# Altium footprint library Connectors.PcbLib: 245 footprints (part 15 of 18)
Each footprint in its own frame and in the unit in brackets; x right, y up, seen from the top. Pads: shape width x height; smd on the part's side, far side on the other; paste and mask are expansions set on the pad; w line width, h text height; cw(c..) or ccw(c..) is an arc to the next point about the centre after c.
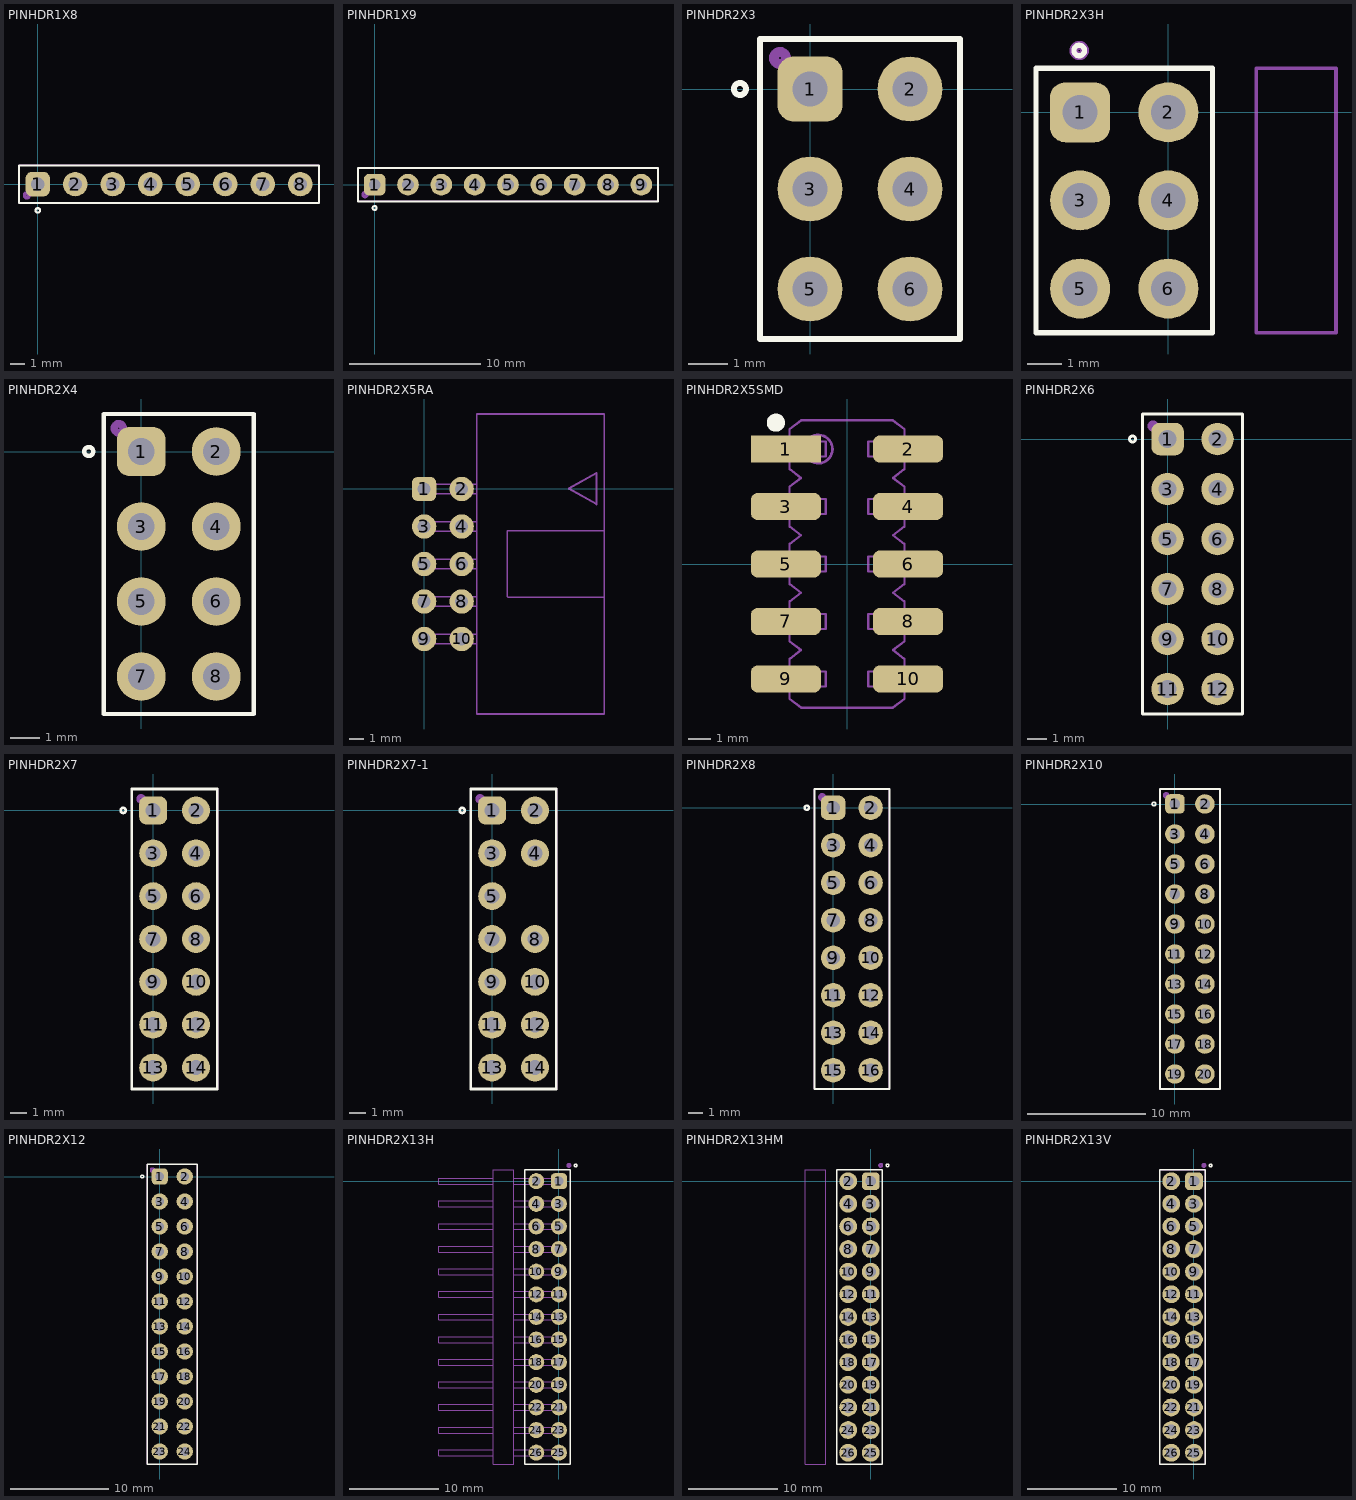
[diagram p14: the footprints below, top view; thin cyan lines are the x and y axes]

## PINHDR1X8 [mil] "Pin header 1x8 pin R2.54mm"
height 433.07
pads (8):
  rrect50% 65x65 hole 35.43 paste-50: 1(0,0)
  round 65 hole 35.43 paste-50: 2(100,0) 3(200,0) 4(300,0) 5(400,0) 6(500,0) 7(600,0) 8(700,0)
Top Overlay:
  circle w5.91: c0,-70 r6
  lines w5.91: -50,-50 750,-50 750,50 -50,50 -50,-50
Mechanical 13:
  circle w10: c-29,-30 r6
  lines w4: -50,-50 750,-50 750,50 -50,50 -50,-50 ; -13,-13 -13,13 13,13 13,-13 -13,-13 ; 87,-13 87,13 113,13 113,-13 87,-13 ; 187,-13 187,13 213,13 213,-13 187,-13 ; 287,-13 287,13 313,13 313,-13 287,-13 ; 387,-13 387,13 413,13 413,-13 387,-13 ; 487,-13 487,13 513,13 513,-13 487,-13 ; 587,-13 587,13 613,13 613,-13 587,-13 ; 687,-13 687,13 713,13 713,-13 687,-13
3D body: height 314.96, standoff -125.98, extent 687,-13 713,13
3D body: height 314.96, standoff -125.98, extent 587,-13 613,13
3D body: height 100, standoff 0, extent -50,-50 750,50
3D body: height 314.96, standoff -125.98, extent 87,-13 113,13
3D body: height 314.96, standoff -125.98, extent -13,-13 13,13
3D body: height 314.96, standoff -125.98, extent 187,-13 213,13
3D body: height 314.96, standoff -125.98, extent 287,-13 313,13
3D body: height 314.96, standoff -125.98, extent 487,-13 513,13
3D body: height 314.96, standoff -125.98, extent 387,-13 413,13

## PINHDR1X9 [mil] "Pin header 1x9 pin R2.54mm"
height 433.07
pads (9):
  rrect50% 65x65 hole 35.43 paste-50: 1(0,0)
  round 65 hole 35.43 paste-50: 2(100,0) 3(200,0) 4(300,0) 5(400,0) 6(500,0) 7(600,0) 8(700,0) 9(800,0)
Top Overlay:
  circle w5.91: c0,-70 r6
  lines w5.91: -50,-50 850,-50 850,50 -50,50 -50,-50
Mechanical 13:
  circle w10: c-29,-30 r6
  lines w4: -50,-50 850,-50 850,50 -50,50 -50,-50 ; -13,-13 13,-13 13,13 -13,13 -13,-13 ; 87,-13 113,-13 113,13 87,13 87,-13 ; 187,-13 213,-13 213,13 187,13 187,-13 ; 287,-13 313,-13 313,13 287,13 287,-13 ; 387,-13 413,-13 413,13 387,13 387,-13 ; 487,-13 513,-13 513,13 487,13 487,-13 ; 587,-13 613,-13 613,13 587,13 587,-13 ; 687,-13 713,-13 713,13 687,13 687,-13 ; 787,-13 813,-13 813,13 787,13 787,-13
3D body: height 366.14, standoff -137.8, extent 687,-13 713,13
3D body: height 366.14, standoff -137.8, extent 787,-13 813,13
3D body: height 366.14, standoff -137.8, extent 587,-13 613,13
3D body: height 100, standoff 0, extent -50,-50 850,50
3D body: height 366.14, standoff -137.8, extent 87,-13 113,13
3D body: height 366.14, standoff -137.8, extent -13,-13 13,13
3D body: height 366.14, standoff -137.8, extent 187,-13 213,13
3D body: height 366.14, standoff -137.8, extent 287,-13 313,13
3D body: height 366.14, standoff -137.8, extent 487,-13 513,13
3D body: height 366.14, standoff -137.8, extent 387,-13 413,13

## PINHDR2X3 [mil] "Pin header 2x3 pin R2.54mm"
height 433.07
pads (6):
  rrect50% 65x65 hole 35.43 paste-50: 1(0,0)
  round 65 hole 35.43 paste-50: 2(100,0) 3(0,-100) 4(100,-100) 5(0,-200) 6(100,-200)
Top Overlay:
  circle w5.91: c-70,0 r6
  lines w5.91: -50,-250 150,-250 150,50 -50,50 -50,-250
Mechanical 13:
  circle w10: c-30,31 r6
  lines w4: -50,-250 -50,50 150,50 150,-250 -50,-250 ; -13,-213 13,-213 13,-187 -13,-187 -13,-213 ; -13,-113 13,-113 13,-87 -13,-87 -13,-113 ; -13,-13 13,-13 13,13 -13,13 -13,-13 ; 87,-213 113,-213 113,-187 87,-187 87,-213 ; 87,-113 113,-113 113,-87 87,-87 87,-113 ; 87,-13 113,-13 113,13 87,13 87,-13
3D body: height 314.96, standoff -125.98, extent -13,-213 13,-187
3D body: height 314.96, standoff -125.98, extent 87,-213 113,-187
3D body: height 314.96, standoff -125.98, extent -13,-113 13,-87
3D body: height 314.96, standoff -125.98, extent 87,-113 113,-87
3D body: height 314.96, standoff -125.98, extent 87,-13 113,13
3D body: height 314.96, standoff -125.98, extent -13,-13 13,13
3D body: height 100, standoff 0, extent -50,-250 150,50

## PINHDR2X3H [mil] "Pin header 2x3 pin R2.54mm Horizontal"
height 321.26
pads (6):
  rrect50% 68x68 hole 39.37 paste-50: 1(-100,0)
  round 68 hole 39.37 paste-50: 2(0,0) 3(-100,-100) 4(0,-100) 5(-100,-200) 6(0,-200)
Top Overlay:
  circle w5.91: c-101,70 r6
  lines w5.91: -150,-250 50,-250 50,50 -150,50 -150,-250
Mechanical 13:
  circle w10: c-101,70 r6
  lines w4: 100,-250 190.16,-250 190.16,50 100,50 100,-250
3D body: height 147.64, standoff 0, extent -113,-13 -87,13
3D body: height 147.64, standoff 0, extent -113,-113 -87,-87
3D body: height 147.64, standoff 0, extent -113,-213 -87,-187
3D body: height 49.21, standoff 0, extent -13,-13 13,13
3D body: height 49.21, standoff 0, extent -13,-113 13,-87
3D body: height 49.21, standoff 0, extent -13,-213 13,-187
3D body: height 196.85, standoff 0, extent 100,-250 190.16,50
3D body: height 74.8, standoff 49.21, extent -13,-213 100,-187
3D body: height 74.8, standoff 49.21, extent -13,-113 100,-87
3D body: height 74.8, standoff 49.21, extent -13,-13 100,13
3D body: height 174.41, standoff 147.64, extent -113,-213 100,-187
3D body: height 174.41, standoff 147.64, extent -113,-113 100,-87
3D body: height 174.41, standoff 147.64, extent -113,-13 100,13
3D body: height 174.41, standoff 147.64, extent 190.16,-213 430,-187
3D body: height 174.41, standoff 147.64, extent 190.16,-113 430,-87
3D body: height 174.41, standoff 147.64, extent 190.16,-13 430,13
3D body: height 74.8, standoff 49.21, extent 190.16,-213 430,-187
3D body: height 74.8, standoff 49.21, extent 190.16,-113 430,-87
3D body: height 74.8, standoff 49.21, extent 190.16,-13 430,13

## PINHDR2X4 [mil] "Pin header 2x4 pin R2.54mm"
height 433.07
pads (8):
  rrect50% 65x65 hole 35.43 paste-50: 1(0,0)
  round 65 hole 35.43 paste-50: 2(100,0) 3(0,-100) 4(100,-100) 5(0,-200) 6(100,-200) 7(0,-300) 8(100,-300)
Top Overlay:
  circle w5.91: c-70,0 r6
  lines w5.91: -50,-350 -50,50 150,50 150,-350 -50,-350
Mechanical 13:
  circle w10: c-30,31 r6
  lines w4: -50,-350 -50,50 150,50 150,-350 -50,-350 ; -13,-313 13,-313 13,-287 -13,-287 -13,-313 ; -13,-213 13,-213 13,-187 -13,-187 -13,-213 ; -13,-113 13,-113 13,-87 -13,-87 -13,-113 ; -13,-13 -13,13 13,13 13,-13 -13,-13 ; 87,-313 113,-313 113,-287 87,-287 87,-313 ; 87,-213 113,-213 113,-187 87,-187 87,-213 ; 87,-113 113,-113 113,-87 87,-87 87,-113 ; 87,-13 87,13 113,13 113,-13 87,-13
3D body: height 314.96, standoff -125.98, extent -13,-313 13,-287
3D body: height 314.96, standoff -125.98, extent 87,-313 113,-287
3D body: height 314.96, standoff -125.98, extent -13,-213 13,-187
3D body: height 314.96, standoff -125.98, extent 87,-213 113,-187
3D body: height 314.96, standoff -125.98, extent -13,-113 13,-87
3D body: height 314.96, standoff -125.98, extent 87,-113 113,-87
3D body: height 100, standoff 0, extent -50,-350 150,50
3D body: height 314.96, standoff -125.98, extent 87,-13 113,13
3D body: height 314.96, standoff -125.98, extent -13,-13 13,13

## PINHDR2X5RA [mil] "Pin header 2x5 pin R2.54mm"
height 433.07
pads (10):
  rrect50% 65x65 hole 35.43 paste-50: 1(0,0)
  round 65 hole 35.43 paste-50: 2(100,0) 3(0,-100) 4(100,-100) 5(0,-200) 6(100,-200) 7(0,-300) 8(100,-300) 9(0,-400) 10(100,-400)
Mechanical 13:
  lines w3.94: 140,-413 -13,-413 -13,-387 140,-387 ; 140,-313 -13,-313 -13,-287 140,-287 ; 140,-213 -13,-213 -13,-187 140,-187 ; 140,-113 -13,-113 -13,-87 140,-87 ; 140,-13 -13,-13 -13,13 140,13 ; 222.24,-287.6 222.24,-111.42
  lines w4: -13,13 -13,-13 13,-13 13,13 ; 87,13 87,-13 113,-13 113,13 ; -13,-413 -13,-387 13,-387 13,-413 -13,-413 ; -13,-313 -13,-287 13,-287 13,-313 -13,-313 ; -13,-213 -13,-187 13,-187 13,-213 -13,-213 ; -13,-113 -13,-87 13,-87 13,-113 -13,-113 ; 87,-413 87,-387 113,-387 113,-413 87,-413 ; 87,-313 87,-287 113,-287 113,-313 87,-313 ; 87,-213 87,-187 113,-187 113,-213 87,-213 ; 87,-113 87,-87 113,-87 113,-113 87,-113
  lines w4.02: 222.24,-111.42 480,-111.42 ; 223.23,-288.59 480,-288.59 ; 140.98,-600 140.98,200 480,200 480,-600 140.98,-600
  lines w5.91: 386.14,0.8 459.96,42.14 459.96,-40.54 386.14,0.8
  text "2" at 70.47,86.6 h59.06
  text "1" at -29.53,66.92 h59.06
  text "10" at 70.47,-447.25 h59.06
  text "9" at -29.53,-447.25 h59.06
3D body: height 362.2, standoff -125.98, extent -12.91,-600.01 480,199.99

## PINHDR2X5SMD [mm] "Pin header 2x5 pin SMD R2.54mm"
height 11
pads (10):
  rect 3.1x1.2 smd: 1(-2.7,5.08)
  rrect50% 3.1x1.2 smd: 2(2.7,5.08) 3(-2.7,2.54) 4(2.7,2.54) 5(-2.7,0) 6(2.7,0) 7(-2.7,-2.54) 8(2.7,-2.54) 9(-2.7,-5.08) 10(2.7,-5.08)
Top Overlay:
  circle w0.4: c-3.146,6.248 r0.2
Mechanical 13:
  circle w0.127: c-1.27,5.08 r0.625
  lines w0.1: -2.54,-5.969 -2.032,-6.35 2.032,-6.35 2.54,-5.969 ; -2.54,-4.191 -2.032,-3.81 -2.54,-3.429 ; -2.54,-1.651 -2.032,-1.27 -2.54,-0.889 ; -2.54,0.889 -2.032,1.27 -2.54,1.651 ; -2.54,3.429 -2.032,3.81 -2.54,4.191 ; -2.54,5.969 -2.032,6.35 ; 2.032,6.35 2.54,5.969 ; 2.54,-4.191 2.032,-3.81 2.54,-3.429 ; 2.54,-1.651 2.032,-1.27 2.54,-0.889 ; 2.54,0.889 2.032,1.27 2.54,1.651 ; 2.54,3.429 2.032,3.81 2.54,4.191
  lines w0.102: -2.54,-5.969 -2.54,-4.191 ; -2.54,-5.41 -3.75,-5.41 -3.75,-4.75 -2.54,-4.75 ; -2.54,-3.429 -2.54,-1.651 ; -2.54,-2.87 -3.75,-2.87 -3.75,-2.21 -2.54,-2.21 ; -2.54,-0.889 -2.54,0.889 ; -2.54,-0.33 -3.75,-0.33 -3.75,0.33 -2.54,0.33 ; -2.54,1.651 -2.54,3.429 ; -2.54,2.21 -3.75,2.21 -3.75,2.87 -2.54,2.87 ; -2.54,4.191 -2.54,5.969 ; -2.54,4.75 -3.75,4.75 -3.75,5.41 -2.54,5.41 ; -2.032,6.35 2.032,6.35 ; 2.54,-5.969 2.54,-4.191 ; 2.54,-5.41 3.75,-5.41 3.75,-4.75 2.54,-4.75 ; 2.54,-3.429 2.54,-1.651 ; 2.54,-2.87 3.75,-2.87 3.75,-2.21 2.54,-2.21 ; 2.54,-0.889 2.54,0.889 ; 2.54,-0.33 3.75,-0.33 3.75,0.33 2.54,0.33 ; 2.54,1.651 2.54,3.429 ; 2.54,2.21 3.75,2.21 3.75,2.87 2.54,2.87 ; 2.54,4.191 2.54,5.969 ; 2.54,4.75 3.75,4.75 3.75,5.41 2.54,5.41 ; -1.6,-5.41 -1.6,-4.75 -0.94,-4.75 -0.94,-5.41 -1.6,-5.41 ; -1.6,-2.87 -1.6,-2.21 -0.94,-2.21 -0.94,-2.87 -1.6,-2.87 ; -1.6,-0.33 -1.6,0.33 -0.94,0.33 -0.94,-0.33 -1.6,-0.33 ; -1.6,2.21 -1.6,2.87 -0.94,2.87 -0.94,2.21 -1.6,2.21 ; -1.6,4.75 -0.94,4.75 -0.94,5.41 -1.6,5.41 -1.6,4.75 ; 0.94,-5.41 1.6,-5.41 1.6,-4.75 0.94,-4.75 0.94,-5.41 ; 0.94,-2.87 1.6,-2.87 1.6,-2.21 0.94,-2.21 0.94,-2.87 ; 0.94,-0.33 1.6,-0.33 1.6,0.33 0.94,0.33 0.94,-0.33 ; 0.94,2.21 1.6,2.21 1.6,2.87 0.94,2.87 0.94,2.21 ; 0.94,4.75 1.6,4.75 1.6,5.41 0.94,5.41 0.94,4.75
3D body: height 0.5, standoff 0, extent 1.6,4.75 3.75,5.41
3D body: height 9.6, standoff 0, extent 0.94,4.75 1.6,5.41
3D body: height 0.5, standoff 0, extent 1.6,2.21 3.75,2.87
3D body: height 9.6, standoff 0, extent 0.94,2.21 1.6,2.87
3D body: height 0.5, standoff 0, extent 1.6,-0.33 3.75,0.33
3D body: height 9.6, standoff 0, extent 0.94,-0.33 1.6,0.33
3D body: height 0.5, standoff 0, extent 1.6,-2.87 3.75,-2.21
3D body: height 9.6, standoff 0, extent 0.94,-2.87 1.6,-2.21
3D body: height 0.5, standoff 0, extent 1.6,-5.41 3.75,-4.75
3D body: height 9.6, standoff 0, extent 0.94,-5.41 1.6,-4.75
3D body: height 0.5, standoff 0, extent -3.75,-5.41 -1.6,-4.75
3D body: height 9.6, standoff 0, extent -1.6,-5.41 -0.94,-4.75
3D body: height 0.5, standoff 0, extent -3.75,-2.87 -1.6,-2.21
3D body: height 9.6, standoff 0, extent -1.6,-2.87 -0.94,-2.21
3D body: height 0.5, standoff 0, extent -3.75,-0.33 -1.6,0.33
3D body: height 9.6, standoff 0, extent -1.6,-0.33 -0.94,0.33
3D body: height 0.5, standoff 0, extent -3.75,2.21 -1.6,2.87
3D body: height 9.6, standoff 0, extent -1.6,2.21 -0.94,2.87
3D body: height 3.6, standoff 0.8, extent -2.54,-6.35 2.54,6.35
3D body: height 9.6, standoff 0, extent -1.6,4.75 -0.94,5.41
3D body: height 0.5, standoff 0, extent -3.75,4.75 -1.6,5.41

## PINHDR2X6 [mil] "Pin header 2x6 pin R2.54mm"
height 433.07
pads (12):
  rrect50% 65x65 hole 35.43 paste-50: 1(0,0)
  round 65 hole 35.43 paste-50: 2(100,0) 3(0,-100) 4(100,-100) 5(0,-200) 6(100,-200) 7(0,-300) 8(100,-300) 9(0,-400) 10(100,-400) 11(0,-500) 12(100,-500)
Top Overlay:
  circle w5.91: c-70,0 r6
  lines w5.91: -50,-550 -50,50 150,50 150,-550 -50,-550
Mechanical 13:
  circle w10: c-29,26 r6
  lines w4: -50,-550 -50,50 150,50 150,-550 -50,-550 ; -13,-513 -13,-487 13,-487 13,-513 -13,-513 ; -13,-413 -13,-387 13,-387 13,-413 -13,-413 ; -13,-313 -13,-287 13,-287 13,-313 -13,-313 ; -13,-213 -13,-187 13,-187 13,-213 -13,-213 ; -13,-113 -13,-87 13,-87 13,-113 -13,-113 ; -13,-13 -13,13 13,13 13,-13 -13,-13 ; 87,-513 87,-487 113,-487 113,-513 87,-513 ; 87,-413 87,-387 113,-387 113,-413 87,-413 ; 87,-313 87,-287 113,-287 113,-313 87,-313 ; 87,-213 87,-187 113,-187 113,-213 87,-213 ; 87,-113 87,-87 113,-87 113,-113 87,-113 ; 87,-13 87,13 113,13 113,-13 87,-13
3D body: height 314.96, standoff -125.98, extent -13,-13 13,13
3D body: height 314.96, standoff -125.98, extent 87,-13 113,13
3D body: height 100, standoff 0, extent -50,-550 150,50
3D body: height 314.96, standoff -125.98, extent 87,-113 113,-87
3D body: height 314.96, standoff -125.98, extent -13,-113 13,-87
3D body: height 314.96, standoff -125.98, extent 87,-213 113,-187
3D body: height 314.96, standoff -125.98, extent -13,-213 13,-187
3D body: height 314.96, standoff -125.98, extent 87,-313 113,-287
3D body: height 314.96, standoff -125.98, extent -13,-313 13,-287
3D body: height 314.96, standoff -125.98, extent 87,-413 113,-387
3D body: height 314.96, standoff -125.98, extent -13,-413 13,-387
3D body: height 314.96, standoff -125.98, extent 87,-513 113,-487
3D body: height 314.96, standoff -125.98, extent -13,-513 13,-487

## PINHDR2X7 [mil] "Pin header 2x7 pin R2.54mm"
height 433.07
pads (14):
  rrect50% 65x65 hole 35.43 paste-50: 1(0,0)
  round 65 hole 35.43 paste-50: 2(100,0) 3(0,-100) 4(100,-100) 5(0,-200) 6(100,-200) 7(0,-300) 8(100,-300) 9(0,-400) 10(100,-400) 11(0,-500) 12(100,-500) 13(0,-600) 14(100,-600)
Top Overlay:
  circle w5.91: c-70,0 r6
  lines w5.91: -50,-650 -50,50 150,50 150,-650 -50,-650
Mechanical 13:
  circle w10: c-28.08,27 r6.08
  lines w4: -50,-650 -50,50 150,50 150,-650 -50,-650 ; -13,-613 -13,-587 13,-587 13,-613 -13,-613 ; -13,-513 -13,-487 13,-487 13,-513 -13,-513 ; -13,-413 -13,-387 13,-387 13,-413 -13,-413 ; -13,-313 -13,-287 13,-287 13,-313 -13,-313 ; -13,-213 -13,-187 13,-187 13,-213 -13,-213 ; -13,-113 -13,-87 13,-87 13,-113 -13,-113 ; -13,-13 -13,13 13,13 13,-13 -13,-13 ; 87,-613 87,-587 113,-587 113,-613 87,-613 ; 87,-513 87,-487 113,-487 113,-513 87,-513 ; 87,-413 87,-387 113,-387 113,-413 87,-413 ; 87,-313 87,-287 113,-287 113,-313 87,-313 ; 87,-213 87,-187 113,-187 113,-213 87,-213 ; 87,-113 87,-87 113,-87 113,-113 87,-113 ; 87,-13 87,13 113,13 113,-13 87,-13
3D body: height 314.96, standoff -125.98, extent -13,-13 13,13
3D body: height 314.96, standoff -125.98, extent 87,-13 113,13
3D body: height 100, standoff 0, extent -50,-650 150,50
3D body: height 314.96, standoff -125.98, extent 87,-113 113,-87
3D body: height 314.96, standoff -125.98, extent -13,-113 13,-87
3D body: height 314.96, standoff -125.98, extent 87,-213 113,-187
3D body: height 314.96, standoff -125.98, extent -13,-213 13,-187
3D body: height 314.96, standoff -125.98, extent 87,-313 113,-287
3D body: height 314.96, standoff -125.98, extent -13,-313 13,-287
3D body: height 314.96, standoff -125.98, extent 87,-413 113,-387
3D body: height 314.96, standoff -125.98, extent -13,-413 13,-387
3D body: height 314.96, standoff -125.98, extent 87,-513 113,-487
3D body: height 314.96, standoff -125.98, extent -13,-513 13,-487
3D body: height 314.96, standoff -125.98, extent 87,-613 113,-587
3D body: height 314.96, standoff -125.98, extent -13,-613 13,-587

## PINHDR2X7-1 [mil] "Pin header 2x7-1 pin R2.54mm JTAG"
height 433.07
pads (13):
  rrect50% 65x65 hole 35.43 paste-50: 1(0,0)
  round 65 hole 35.43 paste-50: 2(100,0) 3(0,-100) 4(100,-100) 5(0,-200) 7(0,-300) 8(100,-300) 9(0,-400) 10(100,-400) 11(0,-500) 12(100,-500) 13(0,-600) 14(100,-600)
Top Overlay:
  circle w5.91: c-70,0 r6
  lines w5.91: -50,-650 150,-650 150,50 -50,50 -50,-650
Mechanical 13:
  circle w10: c-28.08,27 r6.08
  lines w4: -50,-650 150,-650 150,50 -50,50 -50,-650 ; -13,-613 -13,-587 13,-587 13,-613 -13,-613 ; -13,-513 13,-513 13,-487 -13,-487 -13,-513 ; -13,-413 13,-413 13,-387 -13,-387 -13,-413 ; -13,-313 13,-313 13,-287 -13,-287 -13,-313 ; -13,-213 13,-213 13,-187 -13,-187 -13,-213 ; -13,-113 13,-113 13,-87 -13,-87 -13,-113 ; -13,-13 -13,13 13,13 13,-13 -13,-13 ; 87,-613 87,-587 113,-587 113,-613 87,-613 ; 87,-513 87,-487 113,-487 113,-513 87,-513 ; 87,-413 113,-413 113,-387 87,-387 87,-413 ; 87,-313 113,-313 113,-287 87,-287 87,-313 ; 87,-113 113,-113 113,-87 87,-87 87,-113 ; 87,-13 113,-13 113,13 87,13 87,-13
3D body: height 334.65, standoff -125.98, extent -13,-613 13,-587
3D body: height 334.65, standoff -125.98, extent 87,-613 113,-587
3D body: height 334.65, standoff -125.98, extent -13,-513 13,-487
3D body: height 334.65, standoff -125.98, extent 87,-513 113,-487
3D body: height 334.65, standoff -125.98, extent -13,-413 13,-387
3D body: height 334.65, standoff -125.98, extent 87,-413 113,-387
3D body: height 334.65, standoff -125.98, extent -13,-313 13,-287
3D body: height 334.65, standoff -125.98, extent 87,-313 113,-287
3D body: height 334.65, standoff -125.98, extent -13,-213 13,-187
3D body: height 334.65, standoff -125.98, extent -13,-113 13,-87
3D body: height 334.65, standoff -125.98, extent 87,-113 113,-87
3D body: height 100, standoff 0, extent -50,-650 150,50
3D body: height 334.65, standoff -125.98, extent 87,-13 113,13
3D body: height 334.65, standoff -125.98, extent -13,-13 13,13

## PINHDR2X8 [mil] "Pin header 2x8 pin R2.54mm"
height 433.07
pads (16):
  rrect50% 65x65 hole 35.43 paste-50: 1(0,0)
  round 65 hole 35.43 paste-50: 2(100,0) 3(0,-100) 4(100,-100) 5(0,-200) 6(100,-200) 7(0,-300) 8(100,-300) 9(0,-400) 10(100,-400) 11(0,-500) 12(100,-500) 13(0,-600) 14(100,-600) 15(0,-700) 16(100,-700)
Top Overlay:
  circle w5.91: c-70,0 r6
  lines w5.91: -50,-750 150,-750 150,50 -50,50 -50,-750
Mechanical 13:
  circle w10: c-29,28 r6
  lines w4: -50,-750 150,-750 150,50 -50,50 -50,-750 ; -13,-713 -13,-687 13,-687 13,-713 -13,-713 ; -13,-613 -13,-587 13,-587 13,-613 -13,-613 ; -13,-513 -13,-487 13,-487 13,-513 -13,-513 ; -13,-413 -13,-387 13,-387 13,-413 -13,-413 ; -13,-313 -13,-287 13,-287 13,-313 -13,-313 ; -13,-213 -13,-187 13,-187 13,-213 -13,-213 ; -13,-113 -13,-87 13,-87 13,-113 -13,-113 ; -13,-13 -13,13 13,13 13,-13 -13,-13 ; 87,-713 87,-687 113,-687 113,-713 87,-713 ; 87,-613 87,-587 113,-587 113,-613 87,-613 ; 87,-513 87,-487 113,-487 113,-513 87,-513 ; 87,-413 87,-387 113,-387 113,-413 87,-413 ; 87,-313 87,-287 113,-287 113,-313 87,-313 ; 87,-213 87,-187 113,-187 113,-213 87,-213 ; 87,-113 87,-87 113,-87 113,-113 87,-113 ; 87,-13 87,13 113,13 113,-13 87,-13
3D body: height 314.96, standoff -125.98, extent -13,-613 13,-587
3D body: height 314.96, standoff -125.98, extent 87,-613 113,-587
3D body: height 314.96, standoff -125.98, extent -13,-513 13,-487
3D body: height 314.96, standoff -125.98, extent 87,-513 113,-487
3D body: height 314.96, standoff -125.98, extent -13,-413 13,-387
3D body: height 314.96, standoff -125.98, extent 87,-413 113,-387
3D body: height 314.96, standoff -125.98, extent -13,-313 13,-287
3D body: height 314.96, standoff -125.98, extent 87,-313 113,-287
3D body: height 314.96, standoff -125.98, extent -13,-213 13,-187
3D body: height 314.96, standoff -125.98, extent 87,-213 113,-187
3D body: height 314.96, standoff -125.98, extent -13,-113 13,-87
3D body: height 314.96, standoff -125.98, extent 87,-113 113,-87
3D body: height 100, standoff 0, extent -50,-750 150,50
3D body: height 314.96, standoff -125.98, extent 87,-13 113,13
3D body: height 314.96, standoff -125.98, extent -13,-13 13,13
3D body: height 314.96, standoff -125.98, extent 87,-713 113,-687
3D body: height 314.96, standoff -125.98, extent -13,-713 13,-687

## PINHDR2X10 [mil] "Pin header 2x10 pin R2.54mm"
height 433.07
pads (20):
  rrect50% 65x65 hole 35.43 paste-50: 1(0,0)
  round 65 hole 35.43 paste-50: 2(100,0) 3(0,-100) 4(100,-100) 5(0,-200) 6(100,-200) 7(0,-300) 8(100,-300) 9(0,-400) 10(100,-400) 11(0,-500) 12(100,-500) 13(0,-600) 14(100,-600) 15(0,-700) 16(100,-700) 17(0,-800) 18(100,-800) 19(0,-900) 20(100,-900)
Top Overlay:
  circle w5.91: c-70,0 r6
  lines w5.91: -50,-950 150,-950 150,50 -50,50 -50,-950
Mechanical 13:
  circle w10: c-29,29 r6
  lines w4: -50,-950 150,-950 150,50 -50,50 -50,-950 ; -13,-913 -13,-887 13,-887 13,-913 -13,-913 ; -13,-813 -13,-787 13,-787 13,-813 -13,-813 ; -13,-713 -13,-687 13,-687 13,-713 -13,-713 ; -13,-613 -13,-587 13,-587 13,-613 -13,-613 ; -13,-513 -13,-487 13,-487 13,-513 -13,-513 ; -13,-413 -13,-387 13,-387 13,-413 -13,-413 ; -13,-313 -13,-287 13,-287 13,-313 -13,-313 ; -13,-213 -13,-187 13,-187 13,-213 -13,-213 ; -13,-113 -13,-87 13,-87 13,-113 -13,-113 ; -13,-13 -13,13 13,13 13,-13 -13,-13 ; 87,-913 87,-887 113,-887 113,-913 87,-913 ; 87,-813 87,-787 113,-787 113,-813 87,-813 ; 87,-713 87,-687 113,-687 113,-713 87,-713 ; 87,-613 87,-587 113,-587 113,-613 87,-613 ; 87,-513 87,-487 113,-487 113,-513 87,-513 ; 87,-413 87,-387 113,-387 113,-413 87,-413 ; 87,-313 87,-287 113,-287 113,-313 87,-313 ; 87,-213 87,-187 113,-187 113,-213 87,-213 ; 87,-113 87,-87 113,-87 113,-113 87,-113 ; 87,-13 87,13 113,13 113,-13 87,-13
3D body: height 314.96, standoff -125.98, extent -13,-913 13,-887
3D body: height 314.96, standoff -125.98, extent 87,-913 113,-887
3D body: height 314.96, standoff -125.98, extent -13,-813 13,-787
3D body: height 314.96, standoff -125.98, extent 87,-813 113,-787
3D body: height 314.96, standoff -125.98, extent -13,-713 13,-687
3D body: height 314.96, standoff -125.98, extent 87,-713 113,-687
3D body: height 314.96, standoff -125.98, extent -13,-613 13,-587
3D body: height 314.96, standoff -125.98, extent 87,-613 113,-587
3D body: height 314.96, standoff -125.98, extent -13,-513 13,-487
3D body: height 314.96, standoff -125.98, extent 87,-513 113,-487
3D body: height 314.96, standoff -125.98, extent -13,-413 13,-387
3D body: height 314.96, standoff -125.98, extent 87,-413 113,-387
3D body: height 314.96, standoff -125.98, extent -13,-313 13,-287
3D body: height 314.96, standoff -125.98, extent 87,-313 113,-287
3D body: height 314.96, standoff -125.98, extent -13,-213 13,-187
3D body: height 314.96, standoff -125.98, extent 87,-213 113,-187
3D body: height 314.96, standoff -125.98, extent -13,-113 13,-87
3D body: height 314.96, standoff -125.98, extent 87,-113 113,-87
3D body: height 100, standoff 0, extent -50,-950 150,50
3D body: height 314.96, standoff -125.98, extent 87,-13 113,13
3D body: height 314.96, standoff -125.98, extent -13,-13 13,13

## PINHDR2X12 [mil] "Pin header 2x12 pin R2.54mm"
height 433.07
pads (24):
  rrect50% 65x65 hole 35.43 paste-50: 1(0,0)
  round 65 hole 35.43 paste-50: 2(100,0) 3(0,-100) 4(100,-100) 5(0,-200) 6(100,-200) 7(0,-300) 8(100,-300) 9(0,-400) 10(100,-400) 11(0,-500) 12(100,-500) 13(0,-600) 14(100,-600) 15(0,-700) 16(100,-700) 17(0,-800) 18(100,-800) 19(0,-900) 20(100,-900) 21(0,-1000) 22(100,-1000) 23(0,-1100) 24(100,-1100)
Top Overlay:
  circle w5.91: c-70,0 r6
  lines w5.91: -50,-1150 150,-1150 150,50 -50,50 -50,-1150
Mechanical 13:
  circle w10: c-29,26 r6
  lines w4: -50,-1150 150,-1150 150,50 -50,50 -50,-1150 ; -13,-1113 -13,-1087 13,-1087 13,-1113 -13,-1113 ; -13,-1013 -13,-987 13,-987 13,-1013 -13,-1013 ; -13,-913 -13,-887 13,-887 13,-913 -13,-913 ; -13,-813 -13,-787 13,-787 13,-813 -13,-813 ; -13,-713 -13,-687 13,-687 13,-713 -13,-713 ; -13,-613 -13,-587 13,-587 13,-613 -13,-613 ; -13,-513 -13,-487 13,-487 13,-513 -13,-513 ; -13,-413 -13,-387 13,-387 13,-413 -13,-413 ; -13,-313 -13,-287 13,-287 13,-313 -13,-313 ; -13,-213 -13,-187 13,-187 13,-213 -13,-213 ; -13,-113 -13,-87 13,-87 13,-113 -13,-113 ; -13,-13 -13,13 13,13 13,-13 -13,-13 ; 87,-1113 87,-1087 113,-1087 113,-1113 87,-1113 ; 87,-1013 87,-987 113,-987 113,-1013 87,-1013 ; 87,-913 87,-887 113,-887 113,-913 87,-913 ; 87,-813 87,-787 113,-787 113,-813 87,-813 ; 87,-713 87,-687 113,-687 113,-713 87,-713 ; 87,-613 87,-587 113,-587 113,-613 87,-613 ; 87,-513 87,-487 113,-487 113,-513 87,-513 ; 87,-413 87,-387 113,-387 113,-413 87,-413 ; 87,-313 87,-287 113,-287 113,-313 87,-313 ; 87,-213 87,-187 113,-187 113,-213 87,-213 ; 87,-113 87,-87 113,-87 113,-113 87,-113 ; 87,-13 87,13 113,13 113,-13 87,-13
3D body: height 314.96, standoff -125.98, extent -13,-1113 13,-1087
3D body: height 314.96, standoff -125.98, extent 87,-1113 113,-1087
3D body: height 314.96, standoff -125.98, extent -13,-1013 13,-987
3D body: height 314.96, standoff -125.98, extent 87,-1013 113,-987
3D body: height 314.96, standoff -125.98, extent -13,-913 13,-887
3D body: height 314.96, standoff -125.98, extent 87,-913 113,-887
3D body: height 314.96, standoff -125.98, extent -13,-813 13,-787
3D body: height 314.96, standoff -125.98, extent 87,-813 113,-787
3D body: height 314.96, standoff -125.98, extent -13,-713 13,-687
3D body: height 314.96, standoff -125.98, extent 87,-713 113,-687
3D body: height 314.96, standoff -125.98, extent -13,-613 13,-587
3D body: height 314.96, standoff -125.98, extent 87,-613 113,-587
3D body: height 314.96, standoff -125.98, extent -13,-513 13,-487
3D body: height 314.96, standoff -125.98, extent 87,-513 113,-487
3D body: height 314.96, standoff -125.98, extent -13,-413 13,-387
3D body: height 314.96, standoff -125.98, extent 87,-413 113,-387
3D body: height 314.96, standoff -125.98, extent -13,-313 13,-287
3D body: height 314.96, standoff -125.98, extent 87,-313 113,-287
3D body: height 314.96, standoff -125.98, extent -13,-213 13,-187
3D body: height 314.96, standoff -125.98, extent 87,-213 113,-187
3D body: height 314.96, standoff -125.98, extent -13,-113 13,-87
3D body: height 314.96, standoff -125.98, extent 87,-113 113,-87
3D body: height 100, standoff 0, extent -50,-1150 150,50
3D body: height 314.96, standoff -125.98, extent 87,-13 113,13
3D body: height 314.96, standoff -125.98, extent -13,-13 13,13

## PINHDR2X13H [mm] "Pin header 2x13 pin R2.54mm Horizontal"
height 8.16
pads (26):
  rrect50% 1.8x1.8 hole 1 paste-1.27: 1(0,0)
  round 1.8 hole 1 paste-1.27: 2(-2.54,0) 3(0,-2.54) 4(-2.54,-2.54) 5(0,-5.08) 6(-2.54,-5.08) 7(0,-7.62) 8(-2.54,-7.62) 9(0,-10.16) 10(-2.54,-10.16) 11(0,-12.7) 12(-2.54,-12.7) 13(0,-15.24) 14(-2.54,-15.24) 15(0,-17.78) 16(-2.54,-17.78) 17(0,-20.32) 18(-2.54,-20.32) 19(0,-22.86) 20(-2.54,-22.86) 21(0,-25.4) 22(-2.54,-25.4) 23(0,-27.94) 24(-2.54,-27.94) 25(0,-30.48) 26(-2.54,-30.48)
Top Overlay:
  circle w0.15: c1.88,1.778 r0.152
  lines w0.15: -3.81,-31.75 1.27,-31.75 1.27,1.27 -3.81,1.27 -3.81,-31.75
Mechanical 13:
  circle w0.254: c1.118,1.778 r0.152
  lines w0.1: -7.37,-30.81 -13.462,-30.81 -13.462,-30.15 -7.37,-30.15 ; -7.37,-28.27 -13.462,-28.27 -13.462,-27.61 -7.37,-27.61 ; -7.37,-25.73 -13.462,-25.73 -13.462,-25.07 -7.37,-25.07 ; -7.37,-23.19 -13.462,-23.19 -13.462,-22.53 -7.37,-22.53 ; -7.37,-20.65 -13.462,-20.65 -13.462,-19.99 -7.37,-19.99 ; -7.37,-18.11 -13.462,-18.11 -13.462,-17.45 -7.37,-17.45 ; -7.37,-15.57 -13.462,-15.57 -13.462,-14.91 -7.37,-14.91 ; -7.37,-13.03 -13.462,-13.03 -13.462,-12.37 -7.37,-12.37 ; -7.37,-10.49 -13.462,-10.49 -13.462,-9.83 -7.37,-9.83 ; -7.37,-7.95 -13.462,-7.95 -13.462,-7.29 -7.37,-7.29 ; -7.37,-5.41 -13.462,-5.41 -13.462,-4.75 -7.37,-4.75 ; -7.37,-2.87 -13.462,-2.87 -13.462,-2.21 -7.37,-2.21 ; -7.37,-0.33 -13.462,-0.33 -13.462,0.33 -7.37,0.33 ; -5.08,-30.81 0.33,-30.81 0.33,-30.15 -5.08,-30.15 ; -5.08,-28.27 0.33,-28.27 0.33,-27.61 -5.08,-27.61 ; -5.08,-25.73 0.33,-25.73 0.33,-25.07 -5.08,-25.07 ; -5.08,-23.19 0.33,-23.19 0.33,-22.53 -5.08,-22.53 ; -5.08,-20.65 0.33,-20.65 0.33,-19.99 -5.08,-19.99 ; -5.08,-18.11 0.33,-18.11 0.33,-17.45 -5.08,-17.45 ; -5.08,-15.57 0.33,-15.57 0.33,-14.91 -5.08,-14.91 ; -5.08,-13.03 0.33,-13.03 0.33,-12.37 -5.08,-12.37 ; -5.08,-10.49 0.33,-10.49 0.33,-9.83 -5.08,-9.83 ; -5.08,-7.95 0.33,-7.95 0.33,-7.29 -5.08,-7.29 ; -5.08,-5.41 0.33,-5.41 0.33,-4.75 -5.08,-4.75 ; -5.08,-2.87 0.33,-2.87 0.33,-2.21 -5.08,-2.21 ; -5.08,-0.33 0.33,-0.33 0.33,0.33 -5.08,0.33
  lines w0.102: -7.37,-31.75 -5.08,-31.75 -5.08,1.27 -7.37,1.27 -7.37,-31.75
3D body: height 3.75, standoff 0, extent -0.33,-0.33 0.33,0.33
3D body: height 3.75, standoff 0, extent -0.33,-2.87 0.33,-2.21
3D body: height 3.75, standoff 0, extent -0.33,-5.41 0.33,-4.75
3D body: height 3.75, standoff 0, extent -0.33,-7.95 0.33,-7.29
3D body: height 3.75, standoff 0, extent -0.33,-10.49 0.33,-9.83
3D body: height 3.75, standoff 0, extent -0.33,-13.03 0.33,-12.37
3D body: height 3.75, standoff 0, extent -0.33,-15.57 0.33,-14.91
3D body: height 3.75, standoff 0, extent -0.33,-18.11 0.33,-17.45
3D body: height 3.75, standoff 0, extent -0.33,-20.65 0.33,-19.99
3D body: height 3.75, standoff 0, extent -0.33,-23.19 0.33,-22.53
3D body: height 3.75, standoff 0, extent -0.33,-25.73 0.33,-25.07
3D body: height 3.75, standoff 0, extent -0.33,-28.27 0.33,-27.61
3D body: height 3.75, standoff 0, extent -0.33,-30.81 0.33,-30.15
3D body: height 1.25, standoff 0, extent -2.87,-0.33 -2.21,0.33
3D body: height 1.25, standoff 0, extent -2.87,-2.87 -2.21,-2.21
3D body: height 1.25, standoff 0, extent -2.87,-5.41 -2.21,-4.75
3D body: height 1.25, standoff 0, extent -2.87,-7.95 -2.21,-7.29
3D body: height 1.25, standoff 0, extent -2.87,-10.49 -2.21,-9.83
3D body: height 1.25, standoff 0, extent -2.87,-13.03 -2.21,-12.37
3D body: height 1.25, standoff 0, extent -2.87,-15.57 -2.21,-14.91
3D body: height 1.25, standoff 0, extent -2.87,-18.11 -2.21,-17.45
3D body: height 1.25, standoff 0, extent -2.87,-20.65 -2.21,-19.99
3D body: height 1.25, standoff 0, extent -2.87,-23.19 -2.21,-22.53
3D body: height 1.25, standoff 0, extent -2.87,-25.73 -2.21,-25.07
3D body: height 1.25, standoff 0, extent -2.87,-28.27 -2.21,-27.61
3D body: height 1.25, standoff 0, extent -2.87,-30.81 -2.21,-30.15
3D body: height 5, standoff 0, extent -7.37,-31.75 -5.08,1.27
3D body: height 1.9, standoff 1.25, extent -5.08,-30.81 -2.21,-30.15
3D body: height 1.9, standoff 1.25, extent -5.08,-28.27 -2.21,-27.61
3D body: height 1.9, standoff 1.25, extent -5.08,-25.73 -2.21,-25.07
3D body: height 1.9, standoff 1.25, extent -5.08,-23.19 -2.21,-22.53
3D body: height 1.9, standoff 1.25, extent -5.08,-20.65 -2.21,-19.99
3D body: height 1.9, standoff 1.25, extent -5.08,-18.11 -2.21,-17.45
3D body: height 1.9, standoff 1.25, extent -5.08,-15.57 -2.21,-14.91
3D body: height 1.9, standoff 1.25, extent -5.08,-13.03 -2.21,-12.37
3D body: height 1.9, standoff 1.25, extent -5.08,-10.49 -2.21,-9.83
3D body: height 1.9, standoff 1.25, extent -5.08,-7.95 -2.21,-7.29
3D body: height 1.9, standoff 1.25, extent -5.08,-5.41 -2.21,-4.75
3D body: height 1.9, standoff 1.25, extent -5.08,-2.87 -2.21,-2.21
3D body: height 1.9, standoff 1.25, extent -5.08,-0.33 -2.21,0.33
3D body: height 4.43, standoff 3.75, extent -5.08,-30.81 0.33,-30.15
3D body: height 4.43, standoff 3.75, extent -5.08,-28.27 0.33,-27.61
3D body: height 4.43, standoff 3.75, extent -5.08,-25.73 0.33,-25.07
3D body: height 4.43, standoff 3.75, extent -5.08,-23.19 0.33,-22.53
3D body: height 4.43, standoff 3.75, extent -5.08,-20.65 0.33,-19.99
3D body: height 4.43, standoff 3.75, extent -5.08,-18.11 0.33,-17.45
3D body: height 4.43, standoff 3.75, extent -5.08,-15.57 0.33,-14.91
3D body: height 4.43, standoff 3.75, extent -5.08,-13.03 0.33,-12.37
3D body: height 4.43, standoff 3.75, extent -5.08,-10.49 0.33,-9.83
3D body: height 4.43, standoff 3.75, extent -5.08,-7.95 0.33,-7.29
3D body: height 4.43, standoff 3.75, extent -5.08,-5.41 0.33,-4.75
3D body: height 4.43, standoff 3.75, extent -5.08,-2.87 0.33,-2.21
3D body: height 4.43, standoff 3.75, extent -5.08,-0.33 0.33,0.33
3D body: height 4.43, standoff 3.75, extent -13.462,-30.81 -7.37,-30.15
3D body: height 4.43, standoff 3.75, extent -13.462,-28.27 -7.37,-27.61
3D body: height 4.43, standoff 3.75, extent -13.462,-25.73 -7.37,-25.07
3D body: height 4.43, standoff 3.75, extent -13.462,-23.19 -7.37,-22.53
3D body: height 4.43, standoff 3.75, extent -13.462,-20.65 -7.37,-19.99
3D body: height 4.43, standoff 3.75, extent -13.462,-18.11 -7.37,-17.45
3D body: height 4.43, standoff 3.75, extent -13.462,-15.57 -7.37,-14.91
3D body: height 4.43, standoff 3.75, extent -13.462,-13.03 -7.37,-12.37
3D body: height 4.43, standoff 3.75, extent -13.462,-10.49 -7.37,-9.83
3D body: height 4.43, standoff 3.75, extent -13.462,-7.95 -7.37,-7.29
3D body: height 4.43, standoff 3.75, extent -13.462,-5.41 -7.37,-4.75
3D body: height 4.43, standoff 3.75, extent -13.462,-2.87 -7.37,-2.21
3D body: height 4.43, standoff 3.75, extent -13.462,-0.33 -7.37,0.33
3D body: height 1.9, standoff 1.25, extent -13.462,-30.81 -7.37,-30.15
3D body: height 1.9, standoff 1.25, extent -13.462,-28.27 -7.37,-27.61
3D body: height 1.9, standoff 1.25, extent -13.462,-25.73 -7.37,-25.07
3D body: height 1.9, standoff 1.25, extent -13.462,-23.19 -7.37,-22.53
3D body: height 1.9, standoff 1.25, extent -13.462,-20.65 -7.37,-19.99
3D body: height 1.9, standoff 1.25, extent -13.462,-18.11 -7.37,-17.45
3D body: height 1.9, standoff 1.25, extent -13.462,-15.57 -7.37,-14.91
3D body: height 1.9, standoff 1.25, extent -13.462,-13.03 -7.37,-12.37
3D body: height 1.9, standoff 1.25, extent -13.462,-10.49 -7.37,-9.83
3D body: height 1.9, standoff 1.25, extent -13.462,-7.95 -7.37,-7.29
3D body: height 1.9, standoff 1.25, extent -13.462,-5.41 -7.37,-4.75
3D body: height 1.9, standoff 1.25, extent -13.462,-2.87 -7.37,-2.21
3D body: height 1.9, standoff 1.25, extent -13.462,-0.33 -7.37,0.33

## PINHDR2X13HM [mm] "Pin header 2x13 pin R2.54mm Horizontal"
height 8.16
pads (26):
  rrect50% 2x2 hole 1.2 paste-1.27: 1(0,0)
  round 2 hole 1.2 paste-1.27: 2(-2.54,0) 3(0,-2.54) 4(-2.54,-2.54) 5(0,-5.08) 6(-2.54,-5.08) 7(0,-7.62) 8(-2.54,-7.62) 9(0,-10.16) 10(-2.54,-10.16) 11(0,-12.7) 12(-2.54,-12.7) 13(0,-15.24) 14(-2.54,-15.24) 15(0,-17.78) 16(-2.54,-17.78) 17(0,-20.32) 18(-2.54,-20.32) 19(0,-22.86) 20(-2.54,-22.86) 21(0,-25.4) 22(-2.54,-25.4) 23(0,-27.94) 24(-2.54,-27.94) 25(0,-30.48) 26(-2.54,-30.48)
Top Overlay:
  circle w0.15: c1.88,1.778 r0.152
  lines w0.15: -3.81,-31.75 1.27,-31.75 1.27,1.27 -3.81,1.27 -3.81,-31.75
Mechanical 13:
  circle w0.254: c1.118,1.778 r0.152
  lines w0.102: -7.37,-31.75 -5.08,-31.75 -5.08,1.27 -7.37,1.27 -7.37,-31.75
3D body: height 3.75, standoff 0, extent -0.33,-0.33 0.33,0.33
3D body: height 3.75, standoff 0, extent -0.33,-2.87 0.33,-2.21
3D body: height 3.75, standoff 0, extent -0.33,-5.41 0.33,-4.75
3D body: height 3.75, standoff 0, extent -0.33,-7.95 0.33,-7.29
3D body: height 3.75, standoff 0, extent -0.33,-10.49 0.33,-9.83
3D body: height 3.75, standoff 0, extent -0.33,-13.03 0.33,-12.37
3D body: height 3.75, standoff 0, extent -0.33,-15.57 0.33,-14.91
3D body: height 3.75, standoff 0, extent -0.33,-18.11 0.33,-17.45
3D body: height 3.75, standoff 0, extent -0.33,-20.65 0.33,-19.99
3D body: height 3.75, standoff 0, extent -0.33,-23.19 0.33,-22.53
3D body: height 3.75, standoff 0, extent -0.33,-25.73 0.33,-25.07
3D body: height 3.75, standoff 0, extent -0.33,-28.27 0.33,-27.61
3D body: height 3.75, standoff 0, extent -0.33,-30.81 0.33,-30.15
3D body: height 1.25, standoff 0, extent -2.87,-0.33 -2.21,0.33
3D body: height 1.25, standoff 0, extent -2.87,-2.87 -2.21,-2.21
3D body: height 1.25, standoff 0, extent -2.87,-5.41 -2.21,-4.75
3D body: height 1.25, standoff 0, extent -2.87,-7.95 -2.21,-7.29
3D body: height 1.25, standoff 0, extent -2.87,-10.49 -2.21,-9.83
3D body: height 1.25, standoff 0, extent -2.87,-13.03 -2.21,-12.37
3D body: height 1.25, standoff 0, extent -2.87,-15.57 -2.21,-14.91
3D body: height 1.25, standoff 0, extent -2.87,-18.11 -2.21,-17.45
3D body: height 1.25, standoff 0, extent -2.87,-20.65 -2.21,-19.99
3D body: height 1.25, standoff 0, extent -2.87,-23.19 -2.21,-22.53
3D body: height 1.25, standoff 0, extent -2.87,-25.73 -2.21,-25.07
3D body: height 1.25, standoff 0, extent -2.87,-28.27 -2.21,-27.61
3D body: height 1.25, standoff 0, extent -2.87,-30.81 -2.21,-30.15
3D body: height 5, standoff 0, extent -7.37,-31.75 -5.08,1.27
3D body: height 1.9, standoff 1.25, extent -5.08,-30.81 -2.21,-30.15
3D body: height 1.9, standoff 1.25, extent -5.08,-28.27 -2.21,-27.61
3D body: height 1.9, standoff 1.25, extent -5.08,-25.73 -2.21,-25.07
3D body: height 1.9, standoff 1.25, extent -5.08,-23.19 -2.21,-22.53
3D body: height 1.9, standoff 1.25, extent -5.08,-20.65 -2.21,-19.99
3D body: height 1.9, standoff 1.25, extent -5.08,-18.11 -2.21,-17.45
3D body: height 1.9, standoff 1.25, extent -5.08,-15.57 -2.21,-14.91
3D body: height 1.9, standoff 1.25, extent -5.08,-13.03 -2.21,-12.37
3D body: height 1.9, standoff 1.25, extent -5.08,-10.49 -2.21,-9.83
3D body: height 1.9, standoff 1.25, extent -5.08,-7.95 -2.21,-7.29
3D body: height 1.9, standoff 1.25, extent -5.08,-5.41 -2.21,-4.75
3D body: height 1.9, standoff 1.25, extent -5.08,-2.87 -2.21,-2.21
3D body: height 1.9, standoff 1.25, extent -5.08,-0.33 -2.21,0.33
3D body: height 4.43, standoff 3.75, extent -5.08,-30.81 0.33,-30.15
3D body: height 4.43, standoff 3.75, extent -5.08,-28.27 0.33,-27.61
3D body: height 4.43, standoff 3.75, extent -5.08,-25.73 0.33,-25.07
3D body: height 4.43, standoff 3.75, extent -5.08,-23.19 0.33,-22.53
3D body: height 4.43, standoff 3.75, extent -5.08,-20.65 0.33,-19.99
3D body: height 4.43, standoff 3.75, extent -5.08,-18.11 0.33,-17.45
3D body: height 4.43, standoff 3.75, extent -5.08,-15.57 0.33,-14.91
3D body: height 4.43, standoff 3.75, extent -5.08,-13.03 0.33,-12.37
3D body: height 4.43, standoff 3.75, extent -5.08,-10.49 0.33,-9.83
3D body: height 4.43, standoff 3.75, extent -5.08,-7.95 0.33,-7.29
3D body: height 4.43, standoff 3.75, extent -5.08,-5.41 0.33,-4.75
3D body: height 4.43, standoff 3.75, extent -5.08,-2.87 0.33,-2.21
3D body: height 4.43, standoff 3.75, extent -5.08,-0.33 0.33,0.33
3D body: height 4.43, standoff 3.75, extent -13.462,-30.81 -7.37,-30.15
3D body: height 4.43, standoff 3.75, extent -13.462,-28.27 -7.37,-27.61
3D body: height 4.43, standoff 3.75, extent -13.462,-25.73 -7.37,-25.07
3D body: height 4.43, standoff 3.75, extent -13.462,-23.19 -7.37,-22.53
3D body: height 4.43, standoff 3.75, extent -13.462,-20.65 -7.37,-19.99
3D body: height 4.43, standoff 3.75, extent -13.462,-18.11 -7.37,-17.45
3D body: height 4.43, standoff 3.75, extent -13.462,-15.57 -7.37,-14.91
3D body: height 4.43, standoff 3.75, extent -13.462,-13.03 -7.37,-12.37
3D body: height 4.43, standoff 3.75, extent -13.462,-10.49 -7.37,-9.83
3D body: height 4.43, standoff 3.75, extent -13.462,-7.95 -7.37,-7.29
3D body: height 4.43, standoff 3.75, extent -13.462,-5.41 -7.37,-4.75
3D body: height 4.43, standoff 3.75, extent -13.462,-2.87 -7.37,-2.21
3D body: height 4.43, standoff 3.75, extent -13.462,-0.33 -7.37,0.33
3D body: height 1.9, standoff 1.25, extent -13.462,-30.81 -7.37,-30.15
3D body: height 1.9, standoff 1.25, extent -13.462,-28.27 -7.37,-27.61
3D body: height 1.9, standoff 1.25, extent -13.462,-25.73 -7.37,-25.07
3D body: height 1.9, standoff 1.25, extent -13.462,-23.19 -7.37,-22.53
3D body: height 1.9, standoff 1.25, extent -13.462,-20.65 -7.37,-19.99
3D body: height 1.9, standoff 1.25, extent -13.462,-18.11 -7.37,-17.45
3D body: height 1.9, standoff 1.25, extent -13.462,-15.57 -7.37,-14.91
3D body: height 1.9, standoff 1.25, extent -13.462,-13.03 -7.37,-12.37
3D body: height 1.9, standoff 1.25, extent -13.462,-10.49 -7.37,-9.83
3D body: height 1.9, standoff 1.25, extent -13.462,-7.95 -7.37,-7.29
3D body: height 1.9, standoff 1.25, extent -13.462,-5.41 -7.37,-4.75
3D body: height 1.9, standoff 1.25, extent -13.462,-2.87 -7.37,-2.21
3D body: height 1.9, standoff 1.25, extent -13.462,-0.33 -7.37,0.33

## PINHDR2X13V [mm] "Pin header 2x13 pin R2.54mm Vertical"
height 8.16
pads (26):
  rrect50% 2x2 hole 1.2 paste-1.27: 1(0,0)
  round 2 hole 1.2 paste-1.27: 2(-2.54,0) 3(0,-2.54) 4(-2.54,-2.54) 5(0,-5.08) 6(-2.54,-5.08) 7(0,-7.62) 8(-2.54,-7.62) 9(0,-10.16) 10(-2.54,-10.16) 11(0,-12.7) 12(-2.54,-12.7) 13(0,-15.24) 14(-2.54,-15.24) 15(0,-17.78) 16(-2.54,-17.78) 17(0,-20.32) 18(-2.54,-20.32) 19(0,-22.86) 20(-2.54,-22.86) 21(0,-25.4) 22(-2.54,-25.4) 23(0,-27.94) 24(-2.54,-27.94) 25(0,-30.48) 26(-2.54,-30.48)
Top Overlay:
  circle w0.15: c1.88,1.778 r0.152
  lines w0.15: -3.81,-31.75 -3.81,1.27 1.27,1.27 1.27,-31.75 -3.81,-31.75
Mechanical 13:
  circle w0.254: c1.118,1.778 r0.152
  lines w0.1: -3.81,-31.75 -3.81,1.27 1.27,1.27 1.27,-31.75 -3.81,-31.75
3D body: height 2.54, standoff 0, extent -3.81,-31.75 1.27,1.27
3D body: height 8.38, standoff -3.81, extent -2.87,-30.81 -2.21,-30.15
3D body: height 8.38, standoff -3.81, extent -0.33,-30.81 0.33,-30.15
3D body: height 8.38, standoff -3.81, extent -0.33,-28.27 0.33,-27.61
3D body: height 8.38, standoff -3.81, extent -2.87,-28.27 -2.21,-27.61
3D body: height 8.38, standoff -3.81, extent -2.87,-25.73 -2.21,-25.07
3D body: height 8.38, standoff -3.81, extent -0.33,-25.73 0.33,-25.07
3D body: height 8.38, standoff -3.81, extent -0.33,-23.19 0.33,-22.53
3D body: height 8.38, standoff -3.81, extent -2.87,-23.19 -2.21,-22.53
3D body: height 8.38, standoff -3.81, extent -2.87,-20.65 -2.21,-19.99
3D body: height 8.38, standoff -3.81, extent -0.33,-20.65 0.33,-19.99
3D body: height 8.38, standoff -3.81, extent -0.33,-18.11 0.33,-17.45
3D body: height 8.38, standoff -3.81, extent -2.87,-18.11 -2.21,-17.45
3D body: height 8.38, standoff -3.81, extent -2.87,-15.57 -2.21,-14.91
3D body: height 8.38, standoff -3.81, extent -0.33,-15.57 0.33,-14.91
3D body: height 8.38, standoff -3.81, extent -0.33,-13.03 0.33,-12.37
3D body: height 8.38, standoff -3.81, extent -2.87,-13.03 -2.21,-12.37
3D body: height 8.38, standoff -3.81, extent -2.87,-10.49 -2.21,-9.83
3D body: height 8.38, standoff -3.81, extent -0.33,-10.49 0.33,-9.83
3D body: height 8.38, standoff -3.81, extent -0.33,-7.95 0.33,-7.29
3D body: height 8.38, standoff -3.81, extent -2.87,-7.95 -2.21,-7.29
3D body: height 8.38, standoff -3.81, extent -2.87,-5.41 -2.21,-4.75
3D body: height 8.38, standoff -3.81, extent -0.33,-5.41 0.33,-4.75
3D body: height 8.38, standoff -3.81, extent -0.33,-2.87 0.33,-2.21
3D body: height 8.38, standoff -3.81, extent -2.87,-2.87 -2.21,-2.21
3D body: height 8.38, standoff -3.81, extent -0.33,-0.33 0.33,0.33
3D body: height 8.38, standoff -3.81, extent -2.87,-0.33 -2.21,0.33